# Altium footprint library Connect.PcbLib: 272 footprints (part 2 of 17)
Each footprint in its own frame and in the unit in brackets; x right, y up, seen from the top. Pads: shape width x height; smd on the part's side, far side on the other; paste and mask are expansions set on the pad; w line width, h text height; cw(c..) or ccw(c..) is an arc to the next point about the centre after c.
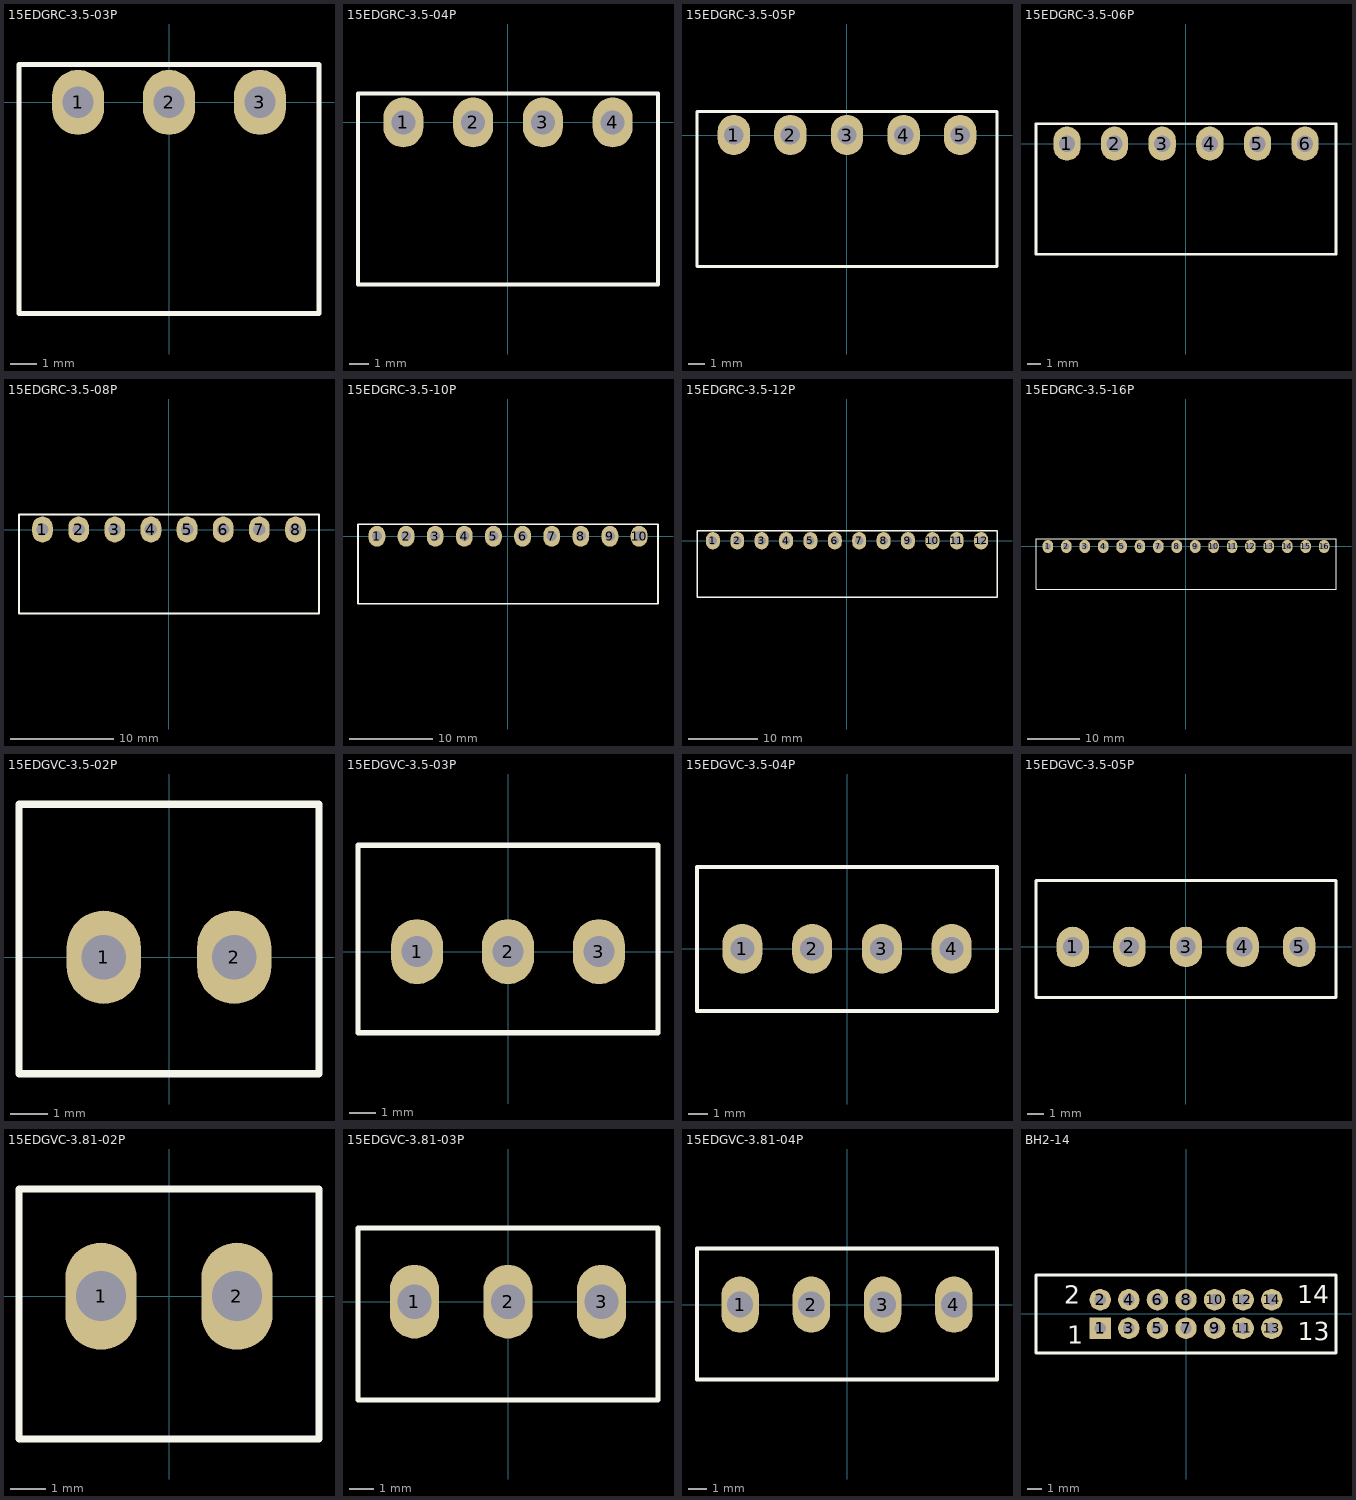
[diagram p1: the footprints below, top view; thin cyan lines are the x and y axes]

## 15EDGRC-3.5-03P [mm]
height 7
pads (3):
  oval 2x2.5 hole 1.2: 1(-3.5,0) 2(0,0) 3(3.5,0)
Top Overlay:
  lines w0.2: -5.775,-8.125 5.775,-8.125 5.775,1.45 -5.775,1.45 -5.775,-8.125
3D body "15EDGRC-3_5-2.STEP": height 7.2, standoff -3.4, extent -5.65,-8 2.15,1.2
3D body "15EDGRC-3_5-2.STEP": height 7.2, standoff -3.4, extent -2.15,-8 5.65,1.2

## 15EDGRC-3.5-04P [mm]
height 7
pads (4):
  oval 2x2.5 hole 1.2: 1(-5.25,0) 2(-1.75,0) 3(1.75,0) 4(5.25,0)
Top Overlay:
  lines w0.2: -7.525,-8.125 7.525,-8.125 7.525,1.45 -7.525,1.45 -7.525,-8.125
3D body "15EDGRC-3_5-2.STEP": height 7.2, standoff -3.4, extent -7.4,-8 0.4,1.2
3D body "15EDGRC-3_5-2.STEP": height 7.2, standoff -3.4, extent -0.4,-8 7.4,1.2

## 15EDGRC-3.5-05P [mm]
height 7
pads (5):
  oval 2x2.5 hole 1.2: 1(-7,0) 2(-3.5,0) 3(0,0) 4(3.5,0) 5(7,0)
Top Overlay:
  lines w0.2: -9.275,-8.125 -9.275,1.45 9.275,1.45 9.275,-8.125 -9.275,-8.125
3D body "15EDGRC-3_5-2.STEP": height 7.2, standoff -3.4, extent -2.15,-8 5.65,1.2
3D body "15EDGRC-3_5-2.STEP": height 7.2, standoff -3.4, extent -9.15,-8 -1.35,1.2
3D body "15EDGRC-3_5-2.STEP": height 7.2, standoff -3.4, extent 1.35,-8 9.15,1.2

## 15EDGRC-3.5-06P [mm]
height 7
pads (6):
  oval 2x2.5 hole 1.2: 1(-8.75,0) 2(-5.25,0) 3(-1.75,0) 4(1.75,0) 5(5.25,0) 6(8.75,0)
Top Overlay:
  lines w0.2: -11.025,-8.125 11.025,-8.125 11.025,1.45 -11.025,1.45 -11.025,-8.125
3D body "15EDGRC-3_5-2.STEP": height 7.2, standoff -3.4, extent -10.9,-8 -3.1,1.2
3D body "15EDGRC-3_5-2.STEP": height 7.2, standoff -3.4, extent -3.9,-8 3.9,1.2
3D body "15EDGRC-3_5-2.STEP": height 7.2, standoff -3.4, extent 3.1,-8 10.9,1.2

## 15EDGRC-3.5-08P [mm]
height 7
pads (8):
  oval 2x2.5 hole 1.2: 1(-12.25,0) 2(-8.75,0) 3(-5.25,0) 4(-1.75,0) 5(1.75,0) 6(5.25,0) 7(8.75,0) 8(12.25,0)
Top Overlay:
  lines w0.2: -14.525,-8.125 14.525,-8.125 14.525,1.45 -14.525,1.45 -14.525,-8.125
3D body "15EDGRC-3_5-2.STEP": height 7.2, standoff -3.4, extent 6.6,-8 14.4,1.2
3D body "15EDGRC-3_5-2.STEP": height 7.2, standoff -3.4, extent -14.4,-8 -6.6,1.2
3D body "15EDGRC-3_5-2.STEP": height 7.2, standoff -3.4, extent -7.4,-8 0.4,1.2
3D body "15EDGRC-3_5-2.STEP": height 7.2, standoff -3.4, extent -0.4,-8 7.4,1.2

## 15EDGRC-3.5-10P [mm]
height 7
pads (10):
  oval 2x2.5 hole 1.2: 1(-15.75,0) 2(-12.25,0) 3(-8.75,0) 4(-5.25,0) 5(-1.75,0) 6(1.75,0) 7(5.25,0) 8(8.75,0) 9(12.25,0) 10(15.75,0)
Top Overlay:
  lines w0.2: -18.025,-8.125 -18.025,1.45 18.025,1.45 18.025,-8.125 -18.025,-8.125
3D body "15EDGRC-3_5-2.STEP": height 7.2, standoff -3.4, extent -3.9,-8 3.9,1.2
3D body "15EDGRC-3_5-2.STEP": height 7.2, standoff -3.4, extent -10.9,-8 -3.1,1.2
3D body "15EDGRC-3_5-2.STEP": height 7.2, standoff -3.4, extent -17.9,-8 -10.1,1.2
3D body "15EDGRC-3_5-2.STEP": height 7.2, standoff -3.4, extent 3.1,-8 10.9,1.2
3D body "15EDGRC-3_5-2.STEP": height 7.2, standoff -3.4, extent 10.1,-8 17.9,1.2

## 15EDGRC-3.5-12P [mm]
height 7
pads (12):
  oval 2x2.5 hole 1.2: 1(-19.25,0) 2(-15.75,0) 3(-12.25,0) 4(-8.75,0) 5(-5.25,0) 6(-1.75,0) 7(1.75,0) 8(5.25,0) 9(8.75,0) 10(12.25,0) 11(15.75,0) 12(19.25,0)
Top Overlay:
  lines w0.2: -21.525,-8.125 21.525,-8.125 21.525,1.45 -21.525,1.45 -21.525,-8.125
3D body "15EDGRC-3_5-2.STEP": height 7.2, standoff -3.4, extent 6.6,-8 14.4,1.2
3D body "15EDGRC-3_5-2.STEP": height 7.2, standoff -3.4, extent -0.4,-8 7.4,1.2
3D body "15EDGRC-3_5-2.STEP": height 7.2, standoff -3.4, extent -21.4,-8 -13.6,1.2
3D body "15EDGRC-3_5-2.STEP": height 7.2, standoff -3.4, extent -14.4,-8 -6.6,1.2
3D body "15EDGRC-3_5-2.STEP": height 7.2, standoff -3.4, extent -7.4,-8 0.4,1.2
3D body "15EDGRC-3_5-2.STEP": height 7.2, standoff -3.4, extent 13.6,-8 21.4,1.2

## 15EDGRC-3.5-16P [mm]
height 7
pads (16):
  oval 2x2.5 hole 1.2: 1(-26.25,0) 2(-22.75,0) 3(-19.25,0) 4(-15.75,0) 5(-12.25,0) 6(-8.75,0) 7(-5.25,0) 8(-1.75,0) 9(1.75,0) 10(5.25,0) 11(8.75,0) 12(12.25,0) 13(15.75,0) 14(19.25,0) 15(22.75,0) 16(26.25,0)
Top Overlay:
  lines w0.2: -28.525,-8.125 -28.525,1.45 28.525,1.45 28.525,-8.125 -28.525,-8.125
3D body "15EDGRC-3_5-2.STEP": height 7.2, standoff -3.4, extent 6.6,-8 14.4,1.2
3D body "15EDGRC-3_5-2.STEP": height 7.2, standoff -3.4, extent -14.4,-8 -6.6,1.2
3D body "15EDGRC-3_5-2.STEP": height 7.2, standoff -3.4, extent -21.4,-8 -13.6,1.2
3D body "15EDGRC-3_5-2.STEP": height 7.2, standoff -3.4, extent -28.4,-8 -20.6,1.2
3D body "15EDGRC-3_5-2.STEP": height 7.2, standoff -3.4, extent -7.4,-8 0.4,1.2
3D body "15EDGRC-3_5-2.STEP": height 7.2, standoff -3.4, extent -0.4,-8 7.4,1.2
3D body "15EDGRC-3_5-2.STEP": height 7.2, standoff -3.4, extent 13.6,-8 21.4,1.2
3D body "15EDGRC-3_5-2.STEP": height 7.2, standoff -3.4, extent 20.6,-8 28.4,1.2

## 15EDGVC-3.5-02P [mm]
height 9.2
pads (2):
  oval 2x2.5 hole 1.2: 1(-1.75,0) 2(1.75,0)
Top Overlay:
  lines w0.2: -4.025,-3.125 -4.025,4.1 4.025,4.1 4.025,-3.125 -4.025,-3.125
3D body: height 1, standoff 0, extent -3.9,-3 3.9,3.975
3D body: height 9.2, standoff 1, extent -3.9,-3 3.9,3.975
3D body: height 9.2, standoff 1, extent -3.5,-2.6 3.5,3.575
3D body: height 8.2, standoff -3.4, extent -2.15,-0.375 -1.35,0.425
3D body: height 8.2, standoff -3.4, extent 1.35,-0.4 2.15,0.4

## 15EDGVC-3.5-03P [mm]
height 9.2
pads (3):
  oval 2x2.5 hole 1.2: 1(-3.5,0) 2(0,0) 3(3.5,0)
Top Overlay:
  lines w0.2: -5.775,-3.125 5.775,-3.125 5.775,4.1 -5.775,4.1 -5.775,-3.125
3D body: height 9.2, standoff 1, extent -5.65,-3 2.15,3.975
3D body: height 9.2, standoff 1, extent -2.15,-3 5.65,3.975
3D body: height 8.2, standoff -3.4, extent -0.4,-0.4 0.4,0.4
3D body: height 8.2, standoff -3.4, extent -3.9,-0.375 -3.1,0.425
3D body: height 9.2, standoff 1, extent -5.25,-2.6 1.75,3.575
3D body: height 1, standoff 0, extent -5.65,-3 5.65,3.975
3D body: height 9.2, standoff 1, extent -1.75,-2.6 5.25,3.575
3D body: height 8.2, standoff -3.4, extent 3.1,-0.4 3.9,0.4

## 15EDGVC-3.5-04P [mm]
height 9.2
pads (4):
  oval 2x2.5 hole 1.2: 1(-5.25,0) 2(-1.75,0) 3(1.75,0) 4(5.25,0)
Top Overlay:
  lines w0.2: -7.525,-3.125 -7.525,4.1 7.525,4.1 7.525,-3.125 -7.525,-3.125
3D body: height 1, standoff 0, extent -7.4,-3 7.375,3.975
3D body: height 9.2, standoff 1, extent -7,-2.6 0,3.575
3D body: height 8.2, standoff -3.4, extent -5.65,-0.375 -4.85,0.425
3D body: height 8.2, standoff -3.4, extent -2.15,-0.4 -1.35,0.4
3D body: height 9.2, standoff 1, extent -0.4,-3 7.4,3.975
3D body: height 9.2, standoff 1, extent 0,-2.6 7,3.575
3D body: height 8.2, standoff -3.4, extent 4.85,-0.4 5.65,0.4
3D body: height 8.2, standoff -3.4, extent 1.35,-0.4 2.15,0.4
3D body: height 9.2, standoff 1, extent -7.4,-3 0.4,3.975
3D body: height 9.2, standoff 1, extent -3.5,-2.6 3.5,3.575

## 15EDGVC-3.5-05P [mm]
height 9.2
pads (5):
  oval 2x2.5 hole 1.2: 1(-7,0) 2(-3.5,0) 3(0,0) 4(3.5,0) 5(7,0)
Top Overlay:
  lines w0.2: -9.275,-3.125 9.275,-3.125 9.275,4.1 -9.275,4.1 -9.275,-3.125
3D body: height 9.2, standoff 1, extent -5.25,-2.6 1.75,3.575
3D body: height 9.2, standoff 1, extent -9.15,-3 -1.35,3.975
3D body: height 8.2, standoff -3.4, extent -0.4,-0.4 0.4,0.4
3D body: height 9.2, standoff 1, extent -1.75,-2.6 5.25,3.575
3D body: height 8.2, standoff -3.4, extent -3.9,-0.4 -3.1,0.4
3D body: height 8.2, standoff -3.4, extent -7.4,-0.375 -6.6,0.425
3D body: height 9.2, standoff 1, extent -8.75,-2.6 -1.75,3.575
3D body: height 1, standoff 0, extent -9.15,-3 9.125,3.975
3D body: height 9.2, standoff 1, extent -1.375,-3 9.15,3.975
3D body: height 9.2, standoff 1, extent 1.75,-2.6 8.75,3.575
3D body: height 8.2, standoff -3.4, extent 6.6,-0.4 7.4,0.4
3D body: height 8.2, standoff -3.4, extent 3.1,-0.4 3.9,0.4

## 15EDGVC-3.81-02P [mm]
height 7
pads (2):
  oval 2x3 hole 1.4: 1(-1.905,0) 2(1.905,0)
Top Overlay:
  lines w0.2: -4.205,-4 4.205,-4 4.205,3 -4.205,3 -4.205,-4
3D body "15EDGVC-3.81-02P.stp": height 9.2, standoff -3.5, extent -4.405,-4.5 4.405,3.1

## 15EDGVC-3.81-03P [mm]
height 7
pads (3):
  oval 2x3 hole 1.4: 1(-3.81,0) 2(0,0) 3(3.81,0)
Top Overlay:
  lines w0.2: -6.11,-4 -6.11,3 6.11,3 6.11,-4 -6.11,-4
3D body "15EDGVC-3.81-02P.stp": height 9.2, standoff -3.5, extent -6.31,-4.5 2.5,3.1
3D body "15EDGVC-3.81-02P.stp": height 9.2, standoff -3.5, extent -2.5,-4.5 6.31,3.1

## 15EDGVC-3.81-04P [mm]
height 7
pads (4):
  oval 2x3 hole 1.4: 1(-5.715,0) 2(-1.905,0) 3(1.905,0) 4(5.715,0)
Top Overlay:
  lines w0.2: -8.015,-4 -8.015,3 8.015,3 8.015,-4 -8.015,-4
3D body "15EDGVC-3.81-02P.stp": height 9.2, standoff -3.5, extent -8.215,-4.5 0.595,3.1
3D body "15EDGVC-3.81-02P.stp": height 9.2, standoff -3.5, extent -4.405,-4.5 4.405,3.1
3D body "15EDGVC-3.81-02P.stp": height 9.2, standoff -3.5, extent -0.595,-4.5 8.215,3.1

## BH2-14 [mm] "Connector IDC 2mm"
height 5.6
pads (14):
  rect 1.5x1.5 hole 0.8: 1(-6,-1)
  round 1.5 hole 0.8: 2(-6,1) 3(-4,-1) 4(-4,1) 5(-2,-1) 6(-2,1) 7(0,-1) 8(0,1) 9(2,-1) 10(2,1) 11(4,-1) 12(4,1) 13(6,-1) 14(6,1)
Top Overlay:
  lines w0.2: -10.5,-2.725 -10.5,2.725 10.5,2.725 10.5,-2.725 -10.5,-2.725
  text "14" at 7.8,0.745 h1.27
  text "13" at 7.825,-1.855 h1.27
  text "2" at -8.51,0.72 h1.27
  text "1" at -8.31,-2.08 h1.27
3D body "BH2-xxBH2-14.STEP": height 5.65, standoff -3.6, extent -10.5,-2.725 10.5,2.725